# Altium footprint library UWRT Footprint Library.PcbLib: 258 footprints (part 8 of 17)
Each footprint in its own frame and in the unit in brackets; x right, y up, seen from the top. Pads: shape width x height; smd on the part's side, far side on the other; paste and mask are expansions set on the pad; w line width, h text height; cw(c..) or ccw(c..) is an arc to the next point about the centre after c.
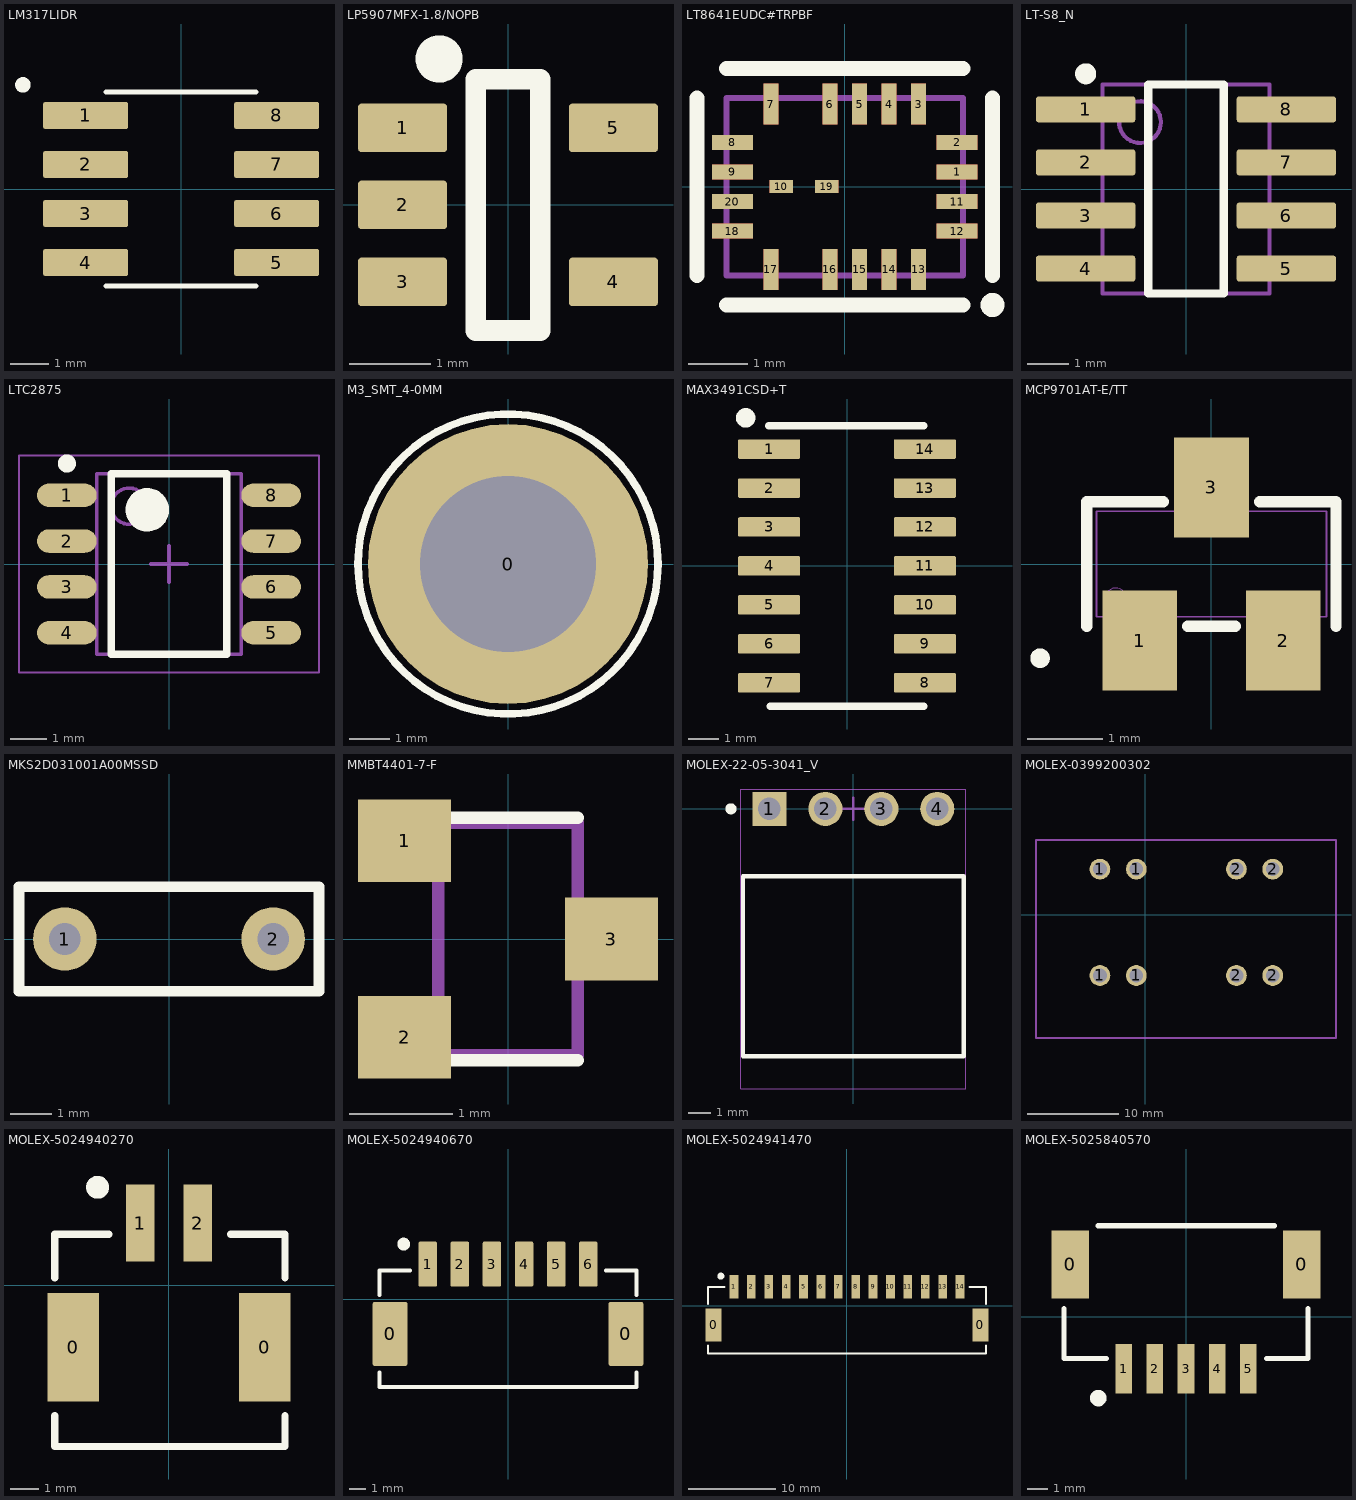
[diagram p7: the footprints below, top view; thin cyan lines are the x and y axes]

## LM317LIDR [mm] "SOIC-8 LDO"
pads (8):
  rrect15% 2.2x0.7 smd: 1(-2.475,1.905) 2(-2.475,0.635) 3(-2.475,-0.635) 4(-2.475,-1.905) 5(2.475,-1.905) 6(2.475,-0.635) 7(2.475,0.635) 8(2.475,1.905)
Top Overlay:
  circle w0.2: c-4.1,2.7 r0.1
  lines w0.127: -1.95,-2.51 1.95,-2.51 ; -1.95,2.51 1.95,2.51
3D body "MAX485CSA+T.STEP": height 1.75, standoff 0, extent -3,-2.45 3,2.45

## LP5907MFX-1.8/NOPB [mm]
height 1.45
pads (5):
  rrect15% 1.1x0.6 smd: 1(-1.3,0.95) 2(-1.3,0) 3(-1.3,-0.95) 4(1.3,-0.95) 5(1.3,0.95)
Top Overlay:
  circle w0.3: c-0.85,1.8 r0.141
  lines w0.254: -0.4,-1.55 -0.4,1.55 0.4,1.55 0.4,-1.55 -0.4,-1.55
3D body "SN74AHC1G02DBVT.stp": height 1.2, standoff 0, extent -1.4,-1.45 1.4,1.45

## LT8641EUDC#TRPBF [mm] "Buck Converter"
height 5
pads (20):
  rect 0.7x0.25 smd: 1(1.9,0.25) 2(1.9,0.75) 8(-1.9,0.75) 9(-1.9,0.25) 11(1.9,-0.25) 12(1.9,-0.75) 18(-1.9,-0.75) 20(-1.9,-0.25)
  rect 0.25x0.7 smd: 3(1.25,1.4) 4(0.75,1.4) 5(0.25,1.4) 6(-0.25,1.4) 7(-1.25,1.4) 13(1.25,-1.4) 14(0.75,-1.4) 15(0.25,-1.4) 16(-0.25,-1.4) 17(-1.25,-1.4)
  rect 0.4x0.22 smd: 10(-1.075,0) 19(-0.305,0)
Top Layer:
  rectangle: -0.375,1.05 -0.125,1.75
  rectangle: 0.125,1.05 0.375,1.75
  rectangle: 0.625,1.05 0.875,1.75
  rectangle: 1.125,1.05 1.375,1.75
  rectangle: -1.375,1.05 -1.125,1.75
  region: -1.55,0.625 -1.55,0.875 -2.25,0.875 -2.25,0.625
  region: -1.55,0.125 -1.55,0.375 -2.25,0.375 -2.25,0.125
  region: -1.55,-0.375 -1.55,-0.125 -2.25,-0.125 -2.25,-0.375
  region: -1.55,-0.875 -1.55,-0.625 -2.25,-0.625 -2.25,-0.875
  region: -1.125,-1.05 -1.375,-1.05 -1.375,-1.75 -1.125,-1.75
  region: -0.125,-1.05 -0.375,-1.05 -0.375,-1.75 -0.125,-1.75
  region: 0.375,-1.05 0.125,-1.05 0.125,-1.75 0.375,-1.75
  region: 0.875,-1.05 0.625,-1.05 0.625,-1.75 0.875,-1.75
  region: 1.375,-1.05 1.125,-1.05 1.125,-1.75 1.375,-1.75
  region: 1.55,-0.625 1.55,-0.875 2.25,-0.875 2.25,-0.625
  region: 1.55,-0.125 1.55,-0.375 2.25,-0.375 2.25,-0.125
  region: 1.55,0.375 1.55,0.125 2.25,0.125 2.25,0.375
  rectangle: -1.275,-0.11 -0.875,0.11
  rectangle: -0.505,-0.11 -0.105,0.11
  region: 1.55,0.875 1.55,0.625 2.25,0.625 2.25,0.875
Top Overlay:
  circle w0.254: c2.5,-2 r0.076
  lines w0.25: -2.5,-1.5 -2.5,1.5 ; -2,-2 2,-2 ; -2,2 2,2 ; 2.5,-1.5 2.5,1.5
Top Paste:
  region: -1.55,0.625 -1.55,0.875 -2.25,0.875 -2.25,0.625
  region: -1.55,0.125 -1.55,0.375 -2.25,0.375 -2.25,0.125
  region: -1.55,-0.375 -1.55,-0.125 -2.25,-0.125 -2.25,-0.375
  region: -1.55,-0.875 -1.55,-0.625 -2.25,-0.625 -2.25,-0.875
  region: 1.375,-1.05 1.125,-1.05 1.125,-1.75 1.375,-1.75
  region: 0.875,-1.05 0.625,-1.05 0.625,-1.75 0.875,-1.75
  region: 0.375,-1.05 0.125,-1.05 0.125,-1.75 0.375,-1.75
  region: -0.125,-1.05 -0.375,-1.05 -0.375,-1.75 -0.125,-1.75
  region: -1.125,-1.05 -1.375,-1.05 -1.375,-1.75 -1.125,-1.75
  rectangle: -1.275,-0.11 -0.875,0.11
  rectangle: -0.505,-0.11 -0.105,0.11
  region: -1.125,1.75 -1.375,1.75 -1.375,1.05 -1.125,1.05
  region: -0.125,1.75 -0.375,1.75 -0.375,1.05 -0.125,1.05
  region: 0.375,1.75 0.125,1.75 0.125,1.05 0.375,1.05
  region: 0.875,1.75 0.625,1.75 0.625,1.05 0.875,1.05
  region: 1.375,1.75 1.125,1.75 1.125,1.05 1.375,1.05
  region: 1.55,0.375 1.55,0.125 2.25,0.125 2.25,0.375
  region: 1.55,-0.125 1.55,-0.375 2.25,-0.375 2.25,-0.125
  region: 1.55,-0.625 1.55,-0.875 2.25,-0.875 2.25,-0.625
Mechanical 13:
  lines w0.1: -2,-1.5 2,-1.5 2,1.5 -2,1.5 -2,-1.5

## LT-S8_N [mm] "SOP, 8-Leads, Body 4.9x3.9mm, Pitch 1.27mm, IPC Medium Density"
height 1.76
pads (8):
  rrect20% 2.375x0.625 smd: 1(-2.4,1.905) 2(-2.4,0.635) 3(-2.4,-0.635) 4(-2.4,-1.905) 5(2.4,-1.905) 6(2.4,-0.635) 7(2.4,0.635) 8(2.4,1.905)
Top Overlay:
  circle w0.25: c-2.4,2.755 r0.125
  lines w0.2: -0.9,-2.5 -0.9,2.5 0.9,2.5 0.9,-2.5 -0.9,-2.5
Mechanical 13:
  circle w0.1: c-1.1,1.6 r0.5
  lines w0.1: -2,-2.5 -2,2.5 2,2.5 2,-2.5 -2,-2.5
3D body "SO-8.step": height 1.45, standoff 0, extent -2.911,-2.4 2.867,2.502

## LTC2875 [mm] "SOIC, 8-Leads, Body 5x4mm, Pitch 1.27mm, IPC Low Density"
height 1.75
pads (8):
  oval 1.65x0.65 smd: 1(-2.825,1.905) 2(-2.825,0.635) 3(-2.825,-0.635) 4(-2.825,-1.905) 5(2.825,-1.905) 6(2.825,-0.635) 7(2.825,0.635) 8(2.825,1.905)
Top Overlay:
  circle w0.25: c-2.825,2.78 r0.125
  circle w0.6: c-0.6,1.5 r0.3
  lines w0.2: -1.6,-2.5 -1.6,2.5 1.6,2.5 1.6,-2.5 -1.6,-2.5
Mechanical 13:
  circle w0.1: c-1.1,1.6 r0.5
  lines w0.1: -2,-2.5 -2,2.5 2,2.5 2,-2.5 -2,-2.5
Mechanical 15:
  lines w0.05: -4.15,-3 -4.15,3 4.15,3 4.15,-3 -4.15,-3
  lines w0.1: -0.5,0 0.5,0 ; 0,-0.5 0,0.5
3D body "SOIC127P600X175-8M.step": height 1.75, standoff 0, extent -3,-2.5 3,2.5

## M3_SMT_4-0MM [mm]
pads (1):
  round 7 hole 4.4: 0(0,0)
Top Overlay:
  circle w0.19: c0,0 r3.75
Top Paste:
  lines w1.2: -2.678,-0.975 ccw(c0,0) -0.975,-2.678 ; -2.678,0.975 cw(c0,0) -0.975,2.678 ; 0.975,-2.678 ccw(c0,0) 2.678,-0.975 ; 0.975,2.678 cw(c0,0) 2.678,0.975
3D body "9774040360R (rev1).stp": height 4.01, standoff -1.39, extent -3,-3 3,3

## MAX3491CSD+T [mil] "RS-422/485 Transceiver footprint (14-SOIC)"
pads (14):
  rrect15% 80x25 smd: 1(-100,150) 2(-100,100) 3(-100,50) 4(-100,0) 5(-100,-50) 6(-100,-100) 7(-100,-150) 8(100,-150) 9(100,-100) 10(100,-50) 11(100,0) 12(100,50) 13(100,100) 14(100,150)
Top Overlay:
  lines w10: -98.5,-180 98.5,-180 ; -98.5,180 -100,180 98.5,180
  lines w15: -125,190.01 ccw(c-130,190) -125,189.99
3D body "User Library-so14-1.STEP": height 66.93, standoff 0, extent -119.61,-173.23 116.61,173.23

## MCP9701AT-E/TT [mil]
pads (3):
  rect 39x52 smd: 1(-37.4,-39.97) 2(37.4,-39.97) 3(0,39.97)
Top Overlay:
  lines w6: -65.04,-32.56 -65.04,32.56 -25.1,32.56 ; -12.3,-32.56 12.3,-32.56 ; 25.1,32.56 65.04,32.56 65.04,-32.56 ; -87.46,-49.21 ccw(c-89.57,-49.21) -87.46,-49.22
Mechanical 13:
  circle w0: c-50.04,-17.56 r5
  lines w1: -60.04,-27.56 -60.04,27.56 60.04,27.56 60.04,-27.56 -60.04,-27.56 ; -48.4,-51.97 -26.4,-51.97 -26.4,-27.56 -48.4,-27.56 -48.4,-51.97 ; -11,27.56 -11,51.97 11,51.97 11,27.56 -11,27.56 ; 26.4,-51.97 48.4,-51.97 48.4,-27.56 26.4,-27.56 26.4,-51.97
3D body "SOT-23_MC.step": height 44.17, standoff 0, extent -60.03,-51.96 60.04,51.97
3D body: height 10, standoff 0, extent 0,0 10,10

## MKS2D031001A00MSSD [mil]
pads (2):
  round 60 hole 30: 1(-98.43,0) 2(98.43,0)
Top Overlay:
  lines w10: -141.73,-49.21 -141.73,-49.21 ; -141.73,-49.21 -141.73,49.21 141.73,49.21 141.73,-49.21 -141.73,-49.21
3D body "User Library-MKS2B042201F00KF00.STEP": height 393.7, standoff -118.11, extent -141.73,-98.43 141.73,98.43

## MMBT4401-7-F [mm]
pads (3):
  rect 0.9x0.8 smd: 1(-1,0.95) 2(-1,-0.95) 3(1,0)
Top Overlay:
  lines w0.12: -0.675,-1.173 0.675,-1.173 ; -0.675,1.173 0.675,1.173
Mechanical 13:
  lines w0.12: -0.675,-1.125 0.675,-1.125 0.675,1.125 -0.675,1.125 -0.675,-1.125
3D body "MMBT4401-7-F.STEP": height 1.1, standoff 0, extent -1.2,-1.45 1.2,1.45

## MOLEX-22-05-3041_V [mm] "CONN, 4-Leads, Body 10.01x8.18mm, Pitch 2.54mm"
height 6.5
pads (4):
  rect 1.55x1.55 hole 1.02: 1(-3.81,0)
  round 1.55 hole 1.02: 2(-1.27,0) 3(1.27,0) 4(3.81,0)
Top Overlay:
  circle w0.25: c-5.554,0 r0.125
  lines w0.2: -5.005,-11.23 -5.005,-3.05 5.005,-3.05 5.005,-11.23 -5.005,-11.23
Mechanical 15:
  lines w0.05: -5.105,-12.711 5.105,-12.711 5.105,0.9 -5.105,0.9 -5.105,-12.711
  lines w0.1: -0.5,0 0.5,0 ; 0,-0.5 0,0.5
3D body "022053041.stp": height 6.43, standoff -3.51, extent -5.004,-12.611 5.004,0.318

## MOLEX-0399200302 [mil] "CONN, 4-Leads, Body 10.01x8.18mm, Pitch 2.54mm"
height 255.91
pads (8):
  round 90 hole 60: 1(-196.85,-263.15) 1(-196.85,196.85) 1(-39.37,-263.15) 1(-39.37,196.85) 2(393.7,-263.15) 2(393.7,196.85) 2(551.18,-263.15) 2(551.18,196.85)
Mechanical 15:
  lines w10: -473.43,-533.46 -473.43,322.83 824.8,322.83 824.8,-533.46 -473.43,-533.46
3D body "399200302.stp": height 1480, standoff -150, extent -448,-512 802,300

## MOLEX-5024940270 [mm] "Molex 5024940670 2 pin 2mm pitch SMD RA connector"
pads (4):
  rect 1.8x3.8 smd: 0(-3.35,-2.175) 0(3.35,-2.175)
  rect 1x2.7 smd: 1(-1,2.175) 2(1,2.175)
Top Overlay:
  circle w0.4: c-2.5,3.425 r0.2
  lines w0.254: -4,-4.572 -4,-5.644 -1.127,-5.644 4.064,-5.644 4.064,-4.572 ; -4,0.254 -4,1.778 -2.096,1.778 ; 2.16,1.778 4.064,1.778 4.064,0.254
3D body "5024940270.stp": height 6.91, standoff 0.01, extent -4,-5.743 4,2.757

## MOLEX-5024940670 [mm] "Molex 5024940670 6 pin 2mm pitch SMD RA connector"
pads (8):
  rrect15% 2.2x4 smd: 0(-7.35,-2.175) 0(7.35,-2.175)
  rrect15% 1.15x2.8 smd: 1(-5,2.175) 2(-3,2.175) 3(-1,2.175) 4(1,2.175) 5(3,2.175) 6(5,2.175)
Top Overlay:
  circle w0.4: c-6.5,3.425 r0.2
  lines w0.254: -8,-4.572 -8,-5.489 -6.858,-5.489 8,-5.489 8,-4.572 ; -8,0.254 -8,1.778 -6.096,1.778 ; 6.096,1.778 8,1.778 8,0.254
3D body "5024940670.stp": height 6.91, standoff 0.01, extent -8,-5.489 8,3.011

## MOLEX-5024941470 [mm] "Molex 5024940670 14 pin 2mm pitch SMD RA connector"
pads (16):
  rect 1.8x3.8 smd: 0(-15.35,-2.175) 0(15.35,-2.175)
  rect 1x2.7 smd: 1(-13,2.175) 2(-11,2.175) 3(-9,2.175) 4(-7,2.175) 5(-5,2.175) 6(-3,2.175) 7(-1,2.175) 8(1,2.175) 9(3,2.175) 10(5,2.175) 11(7,2.175) 12(9,2.175) 13(11,2.175) 14(13,2.175)
Top Overlay:
  circle w0.4: c-14.5,3.425 r0.2
  lines w0.254: -16,-4.572 -16,-5.489 16,-5.489 16,-4.572 ; -16,0.254 -16,2.175 -14.096,2.175 ; 14.096,2.175 16,2.175 16,0.254
3D body "5024941470.stp": height 6.91, standoff 0.01, extent -16,-5.425 16,3.075

## MOLEX-5025840570 [mm] "Molex 5024940670 12 pin 1.5 mm pitch SMD vertical connector"
pads (7):
  rect 1.8x3.3 smd: 0(-5.6,2.525) 0(5.6,2.525)
  rect 0.8x2.4 smd: 1(-3,-2.525) 2(-1.5,-2.525) 3(0,-2.525) 4(1.5,-2.525) 5(3,-2.525)
Top Overlay:
  circle w0.4: c-4.239,-3.937 r0.2
  lines w0.254: -5.9,0.396 -5.9,-2.017 -3.858,-2.017 ; -4.239,4.393 4.27,4.393 ; 3.889,-2.017 5.9,-2.017 5.9,0.396
3D body "5025840570.stp": height 7.31, standoff 0.01, extent -5.9,-3.007 5.9,4.393